# Altium footprint library 全库.PcbLib: 967 footprints (part 33 of 61)
Each footprint in its own frame and in the unit in brackets; x right, y up, seen from the top. Pads: shape width x height; smd on the part's side, far side on the other; paste and mask are expansions set on the pad; w line width, h text height; cw(c..) or ccw(c..) is an arc to the next point about the centre after c.
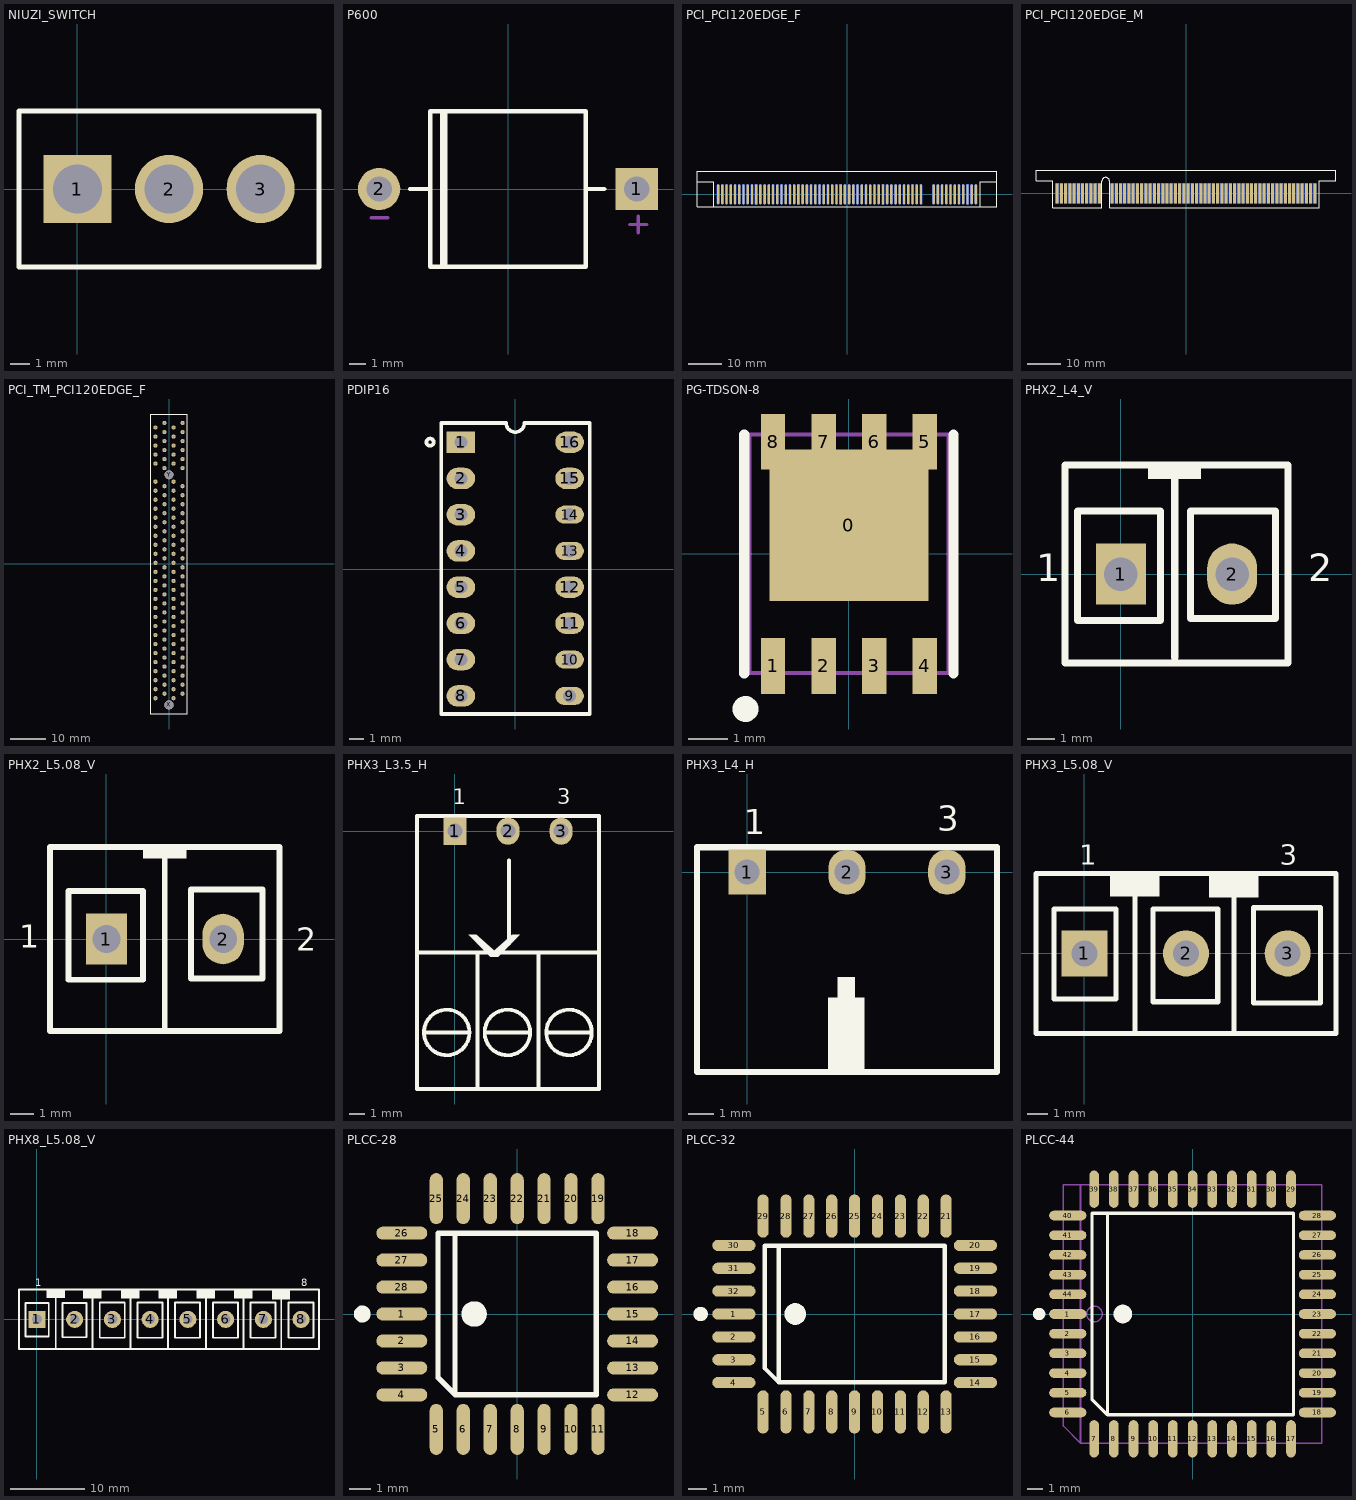
[diagram p32: the footprints below, top view; thin cyan lines are the x and y axes]

## NIUZI_SWITCH [mm] "3.81mm(150mil)焊线"
pads (3):
  rect 3.5x3.5 hole 2.5: 1(0,0)
  round 3.5 hole 2.5: 2(4.7,0) 3(9.4,0)
Top Overlay:
  lines w0.254: -3,-4 -3,4 12.4,4 12.4,-4 -3,-4

## P600 [mm]
pads (2):
  rect 2.5x2.5 hole 1.5: 1(7.62,0)
  round 2.5 hole 1.5: 2(-7.62,0)
Top Overlay:
  lines w0.254: -5.8,0 -4.6,0 ; -3.9,-4.6 -3.9,4.6 ; -3.7,-4.6 -3.7,4.6 ; 4.6,0 5.7,0 ; -4.6,-4.6 4.6,-4.6 4.6,4.6 -4.6,4.6 -4.6,-4.6
Mechanical 15:
  lines w0.203: -8.1,-1.7 -7.1,-1.7 ; 7.2,-2.1 8.2,-2.1 ; 7.7,-2.6 7.7,-1.6

## PCI_PCI120EDGE_F [mm]
pads (120):
  oval 0.7x6 smd: A1(-38.735,0) A2(-37.465,0) A3(-36.195,0) A4(-34.925,0) A5(-33.655,0) A6(-32.385,0) A7(-31.115,0) A8(-29.845,0) A9(-28.575,0) A11(-26.035,0) A12(-24.765,0) A13(-23.495,0) A14(-22.225,0) A15(-20.955,0) A16(-19.685,0) A17(-18.415,0) A18(-17.145,0) A19(-15.875,0) A21(-13.335,0) A22(-12.065,0) A23(-10.795,0) A24(-9.525,0) A25(-8.255,0) A26(-6.985,0) A27(-5.715,0) A28(-4.445,0) A29(-3.175,0) A31(-0.635,0) A32(0.635,0) A33(1.905,0) A34(3.175,0) A35(4.445,0) A36(5.715,0) A37(6.985,0) A38(8.255,0) A39(9.525,0) A41(12.065,0) A42(13.335,0) A43(14.605,0) A44(15.875,0) A45(17.145,0) A46(18.415,0) A47(19.685,0) A48(20.955,0) A49(22.225,0) A52(26.035,0) A53(27.305,0) A54(28.575,0) A55(29.845,0) A56(31.115,0) A57(32.385,0) A58(33.655,0) A59(34.925,0) A61(37.465,0) A62(38.735,0)
  rect 0.7x6 smd: A10(-27.305,0) A20(-14.605,0) A30(-1.905,0) A40(10.795,0) A60(36.195,0)
  oval 0.7x6 smd far side: B1(-38.735,0) B2(-37.465,0) B3(-36.195,0) B4(-34.925,0) B5(-33.655,0) B6(-32.385,0) B7(-31.115,0) B8(-29.845,0) B9(-28.575,0) B11(-26.035,0) B12(-24.765,0) B13(-23.495,0) B14(-22.225,0) B15(-20.955,0) B16(-19.685,0) B17(-18.415,0) B18(-17.145,0) B19(-15.875,0) B21(-13.335,0) B22(-12.065,0) B23(-10.795,0) B24(-9.525,0) B25(-8.255,0) B26(-6.985,0) B27(-5.715,0) B28(-4.445,0) B29(-3.175,0) B31(-0.635,0) B32(0.635,0) B33(1.905,0) B34(3.175,0) B35(4.445,0) B36(5.715,0) B37(6.985,0) B38(8.255,0) B39(9.525,0) B41(12.065,0) B42(13.335,0) B43(14.605,0) B44(15.875,0) B45(17.145,0) B46(18.415,0) B47(19.685,0) B48(20.955,0) B49(22.225,0) B52(26.035,0) B53(27.305,0) B54(28.575,0) B55(29.845,0) B56(31.115,0) B57(32.385,0) B58(33.655,0) B59(34.925,0) B61(37.465,0) B62(38.735,0)
  rect 0.7x6 smd far side: B10(-27.305,0) B20(-14.605,0) B30(-1.905,0) B40(10.795,0) B60(36.195,0)
Top Overlay:
  lines w0.2: -45.085,3.81 -45.085,-3.81 -40.005,-3.81 ; -45.085,3.81 -45.085,6.985 45.085,6.985 45.085,3.81 ; -45.085,3.81 -40.005,3.81 -40.005,-3.81 ; -40.005,-3.81 25.273,-3.81 40.005,-3.81 ; 40.005,-3.81 45.085,-3.81 45.085,3.81 ; 40.005,-3.81 40.005,3.81 45.085,3.81
Bottom Overlay:
  lines w0.2: -45.085,3.81 -45.085,-3.81 -40.005,-3.81 ; -45.085,3.81 -45.085,6.985 45.085,6.985 45.085,3.81 ; -45.085,3.81 -40.005,3.81 -40.005,-3.81 ; -40.005,-3.81 25.273,-3.81 40.005,-3.81 ; 40.005,-3.81 45.085,-3.81 45.085,3.81 ; 40.005,-3.81 40.005,3.81 45.085,3.81

## PCI_PCI120EDGE_M [mm]
pads (120):
  rect 0.9x6 smd: A1(38.735,0) A2(37.465,0) A3(36.195,0) A4(34.925,0) A5(33.655,0) A6(32.385,0) A7(31.115,0) A8(29.845,0) A9(28.575,0) A10(27.305,0) A11(26.035,0) A12(24.765,0) A13(23.495,0) A14(22.225,0) A15(20.955,0) A16(19.685,0) A17(18.415,0) A18(17.145,0) A19(15.875,0) A20(14.605,0) A21(13.335,0) A22(12.065,0) A23(10.795,0) A24(9.525,0) A25(8.255,0) A26(6.985,0) A27(5.715,0) A28(4.445,0) A29(3.175,0) A30(1.905,0) A31(0.635,0) A32(-0.635,0) A33(-1.905,0) A34(-3.175,0) A35(-4.445,0) A36(-5.715,0) A37(-6.985,0) A38(-8.255,0) A39(-9.525,0) A40(-10.795,0) A41(-12.065,0) A42(-13.335,0) A43(-14.605,0) A44(-15.875,0) A45(-17.145,0) A46(-18.415,0) A47(-19.685,0) A48(-20.955,0) A49(-22.225,0) A52(-26.035,0) A53(-27.305,0) A54(-28.575,0) A55(-29.845,0) A56(-31.115,0) A57(-32.385,0) A58(-33.655,0) A59(-34.925,0) A60(-36.195,0) A61(-37.465,0) A62(-38.735,0)
  rect 0.9x6 smd far side: B1(38.735,0) B2(37.465,0) B3(36.195,0) B4(34.925,0) B5(33.655,0) B6(32.385,0) B7(31.115,0) B8(29.845,0) B9(28.575,0) B10(27.305,0) B11(26.035,0) B12(24.765,0) B13(23.495,0) B14(22.225,0) B15(20.955,0) B16(19.685,0) B17(18.415,0) B18(17.145,0) B19(15.875,0) B20(14.605,0) B21(13.335,0) B22(12.065,0) B23(10.795,0) B24(9.525,0) B25(8.255,0) B26(6.985,0) B27(5.715,0) B28(4.445,0) B29(3.175,0) B30(1.905,0) B31(0.635,0) B32(-0.635,0) B33(-1.905,0) B34(-3.175,0) B35(-4.445,0) B36(-5.715,0) B37(-6.985,0) B38(-8.255,0) B39(-9.525,0) B40(-10.795,0) B41(-12.065,0) B42(-13.335,0) B43(-14.605,0) B44(-15.875,0) B45(-17.145,0) B46(-18.415,0) B47(-19.685,0) B48(-20.955,0) B49(-22.225,0) B52(-26.035,0) B53(-27.305,0) B54(-28.575,0) B55(-29.845,0) B56(-31.115,0) B57(-32.385,0) B58(-33.655,0) B59(-34.925,0) B60(-36.195,0) B61(-37.465,0) B62(-38.735,0)
Top Overlay:
  lines w0.2: -45.085,3.81 -40.005,3.81 -40.005,-4.31 -25.273,-4.31 -25.273,3.683 cw(c-24.13,3.683) -22.987,3.683 -22.987,-4.31 40.005,-4.31 40.005,3.81 45.085,3.81 45.085,6.985 -45.085,6.985 -45.085,3.81
Bottom Overlay:
  lines w0.2: -45.085,3.81 -40.005,3.81 -40.005,-4.31 -25.273,-4.31 -25.273,3.683 cw(c-24.13,3.683) -22.987,3.683 -22.987,-4.31 40.005,-4.31 40.005,3.81 45.085,3.81 45.085,6.985 -45.085,6.985 -45.085,3.81

## PCI_TM_PCI120EDGE_F [mm]
pads (122):
  round 1.2 hole 0.6: A1(-3.81,-37.779) A2(-1.27,-36.509) A3(-3.81,-35.239) A4(-1.27,-33.969) A5(-3.81,-32.699) A6(-1.27,-31.429) A7(-3.81,-30.159) A8(-1.27,-28.889) A9(-3.81,-27.619) A10(-1.27,-26.349) A11(-3.81,-25.079) A12(-1.27,-23.809) A13(-3.81,-22.539) A14(-1.27,-21.269) A15(-3.81,-19.999) A16(-1.27,-18.729) A17(-3.81,-17.459) A18(-1.27,-16.189) A19(-3.81,-14.919) A20(-1.27,-13.649) A21(-3.81,-12.379) A22(-1.27,-11.109) A23(-3.81,-9.839) A24(-1.27,-8.569) A25(-3.81,-7.299) A26(-1.27,-6.029) A27(-3.81,-4.759) A28(-1.27,-3.489) A29(-3.81,-2.219) A30(-1.27,-0.949) A31(-3.81,0.321) A32(-1.27,1.591) A33(-3.81,2.861) A34(-1.27,4.131) A35(-3.81,5.401) A36(-1.27,6.671) A37(-3.81,7.941) A38(-1.27,9.211) A39(-3.81,10.481) A40(-1.27,11.751) A41(-3.81,13.021) A42(-1.27,14.291) A43(-3.81,15.561) A44(-1.27,16.831) A45(-3.81,18.101) A46(-1.27,19.371) A47(-3.81,20.641) A48(-1.27,21.911) A49(-3.81,23.181) A52(-1.27,26.991) A53(-3.81,28.261) A54(-1.27,29.531) A55(-3.81,30.801) A56(-1.27,32.071) A57(-3.81,33.341) A58(-1.27,34.611) A59(-3.81,35.881) A60(-1.27,37.151) A61(-3.81,38.421) A62(-1.27,39.691) B1(1.27,-37.779) B2(3.81,-36.509) B3(1.27,-35.239) B4(3.81,-33.969) B5(1.27,-32.699) B6(3.81,-31.429) B7(1.27,-30.159) B8(3.81,-28.889) B9(1.27,-27.619) B10(3.81,-26.349) B11(1.27,-25.079) B12(3.81,-23.809) B13(1.27,-22.539) B14(3.81,-21.269) B15(1.27,-19.999) B16(3.81,-18.729) B17(1.27,-17.459) B18(3.81,-16.189) B19(1.27,-14.919) B20(3.81,-13.649) B21(1.27,-12.379) B22(3.81,-11.109) B23(1.27,-9.839) B24(3.81,-8.569) B25(1.27,-7.299) B26(3.81,-6.029) B27(1.27,-4.759) B28(3.81,-3.489) B29(1.27,-2.219) B30(3.81,-0.949) B31(1.27,0.321) B32(3.81,1.591) B33(1.27,2.861) B34(3.81,4.131) B35(1.27,5.401) B36(3.81,6.671) B37(1.27,7.941) B38(3.81,9.211) B39(1.27,10.481) B40(3.81,11.751) B41(1.27,13.021) B42(3.81,14.291) B43(1.27,15.561) B44(3.81,16.831) B45(1.27,18.101) B46(3.81,19.371) B47(1.27,20.641) B48(3.81,21.911) B49(1.27,23.181) B52(3.81,26.991) B53(1.27,28.261) B54(3.81,29.531) B55(1.27,30.801) B56(3.81,32.071) B57(1.27,33.341) B58(3.81,34.611) B59(1.27,35.881) B60(3.81,37.151) B61(1.27,38.421) B62(3.81,39.691)
  round 2.5 hole 2.44: X(0,-39.679) Y(0,25.091)
Top Overlay:
  lines w0.254: -5.08,-42.229 -5.08,42.221 5.08,42.221 5.08,-42.221 -5.08,-42.221

## PDIP16 [mm]
pads (16):
  rect 2x1.5 hole 0.9: 1(-3.81,8.89)
  oval 2x1.5 hole 0.9: 2(-3.81,6.35) 3(-3.81,3.81) 4(-3.81,1.27) 5(-3.81,-1.27) 6(-3.81,-3.81) 7(-3.81,-6.35) 8(-3.81,-8.89) 11(3.81,-3.81) 12(3.81,-1.27) 15(3.81,6.35) 16(3.81,8.89)
  oval 2x1.27 hole 0.9: 9(3.81,-8.89) 10(3.81,-6.35) 13(3.81,1.27) 14(3.81,3.81)
Top Overlay:
  circle w0.254: c-5.969,8.89 r0.254
  lines w0.254: -5.19,-10.16 -5.19,10.23 -0.635,10.23 ccw(c0,10.23) 0.635,10.23 5.21,10.23 5.21,-10.16 -5.19,-10.16

## PG-TDSON-8 [mm]
pads (9):
  rect 4x3.81 smd: 0(0,0.716)
  rect 0.61x1.4 smd: 1(-1.905,-2.816) 2(-0.635,-2.816) 3(0.635,-2.816) 4(1.905,-2.816) 5(1.905,2.816) 6(0.635,2.816) 7(-0.635,2.816) 8(-1.905,2.816)
Top Overlay:
  circle w0.4: c-2.6,-3.9 r0.125
  lines w0.254: -2.63,-3 -2.63,3 ; 2.63,-3 2.63,3
Mechanical 13:
  lines w0.1: -2.5,-3 2.5,-3 2.5,3 -2.5,3 -2.5,-3

## PHX2_L4_V [mm]
pads (2):
  rect 1.8x2.2 hole 1.2: 1(0,0)
  oval 1.8x2.2 hole 1.2: 2(4,0)
Top Overlay:
  rectangle: 0.984,3.413 2.889,3.913
  lines w0.254: 1.937,-3 1.937,3.596 ; -2,-3.191 6,-3.191 6,3.913 -2,3.913 -2,-3.191 ; -1.556,-1.667 1.429,-1.667 1.429,2.27 -1.556,2.27 -1.556,-1.667 ; 2.508,-1.603 2.508,2.27 5.556,2.27 5.556,-1.603 2.508,-1.603
  text "2" at 6.731,-0.254 h1
  text "1" at -3.048,-0.254 h1

## PHX2_L5.08_V [mm]
pads (2):
  rect 1.8x2.2 hole 1.2: 1(0,0)
  oval 1.8x2.2 hole 1.2: 2(5.08,0)
Top Overlay:
  rectangle: 1.587,3.5 3.492,4
  lines w0.254: 2.54,-4 2.54,4 ; -2.46,-4 -2.46,4 7.54,4 7.54,-4 -2.46,-4 ; -1.651,-1.778 -1.651,2.095 1.587,2.095 1.587,-1.778 -1.651,-1.778 ; 3.683,-1.714 6.794,-1.714 6.794,2.159 3.683,2.159 3.683,-1.714
  text "1" at -3.81,-0.381 h1
  text "2" at 8.255,-0.508 h1

## PHX3_L3.5_H [mm]
pads (3):
  rect 1.5x1.8 hole 1: 1(0,0)
  oval 1.5x1.8 hole 1: 2(3.5,0) 3(7,0)
Top Overlay:
  circle w0.254: c7.525,-13.271 r1.5
  circle w0.254: c3.461,-13.271 r1.5
  circle w0.254: c-0.54,-13.271 r1.5
  lines w0.254: -2.5,-8 9.5,-8 ; -1.865,-13.271 0.802,-13.271 ; 1.5,-17 1.5,-8 ; 2.135,-13.271 4.802,-13.271 ; 3.564,-7.422 3.564,-1.922 ; 5.5,-17 5.5,-8 ; 6.199,-13.271 8.866,-13.271 ; -2.5,-17 -2.5,1 9.5,1 9.5,-17 -2.5,-17
  text "3" at 6.731,1.778 h1
  text "1" at -0.127,1.778 h1
  text "^" at 4.897,-4.318 h4

## PHX3_L4_H [mm]
pads (3):
  rect 1.5x1.8 hole 1: 1(0,0)
  oval 1.5x1.8 hole 1: 2(4,0) 3(8,0)
Top Overlay:
  rectangle: 3.619,-7.993 4.317,-4.183
  rectangle: 3.238,-7.993 4.698,-5.009
  lines w0.254: -2,-7.993 10,-7.993 10,1 -2,1 -2,-7.993
  text "1" at -0.127,1.524 h1
  text "3" at 7.62,1.651 h1

## PHX3_L5.08_V [mm]
pads (3):
  rect 2.3x2.3 hole 1.3: 1(0,0)
  round 2.3 hole 1.3: 2(5.08,0) 3(10.16,0)
Top Overlay:
  rectangle: 1.27,2.857 3.746,4
  rectangle: 6.223,2.794 8.7,4
  lines w0.254: 2.533,-4 2.533,4 ; 7.486,-4 7.486,4 ; -2.42,-4 12.58,-4 12.58,4 -2.42,4 -2.42,-4 ; -1.524,-2.286 -1.524,2.222 1.587,2.222 1.587,-2.286 -1.524,-2.286 ; 3.429,-2.413 3.429,2.222 6.667,2.222 6.667,-2.413 3.429,-2.413 ; 8.445,-2.476 8.445,2.286 11.811,2.286 11.811,-2.476 8.445,-2.476
  text "1" at -0.254,4.445 h1
  text "3" at 9.779,4.445 h1

## PHX8_L5.08_V [mm]
pads (8):
  rect 2.3x2.3 hole 1.3: 1(0,0)
  round 2.3 hole 1.3: 2(5.08,0) 3(10.16,0) 4(15.24,0) 5(20.32,0) 6(25.4,0) 7(30.48,0) 8(35.56,0)
Top Overlay:
  rectangle: 31.623,2.667 34.099,3.873
  rectangle: 26.543,2.794 29.019,4
  rectangle: 21.463,2.794 23.939,4
  rectangle: 16.383,2.794 18.86,4
  rectangle: 11.303,2.794 13.779,4
  rectangle: 1.27,2.857 3.746,4
  rectangle: 6.223,2.794 8.7,4
  lines w0.254: 2.533,-4 2.533,4 ; 7.486,-4 7.486,4 ; 12.573,-4 12.573,4 ; 17.653,-4 17.653,4 ; 22.733,-4 22.733,4 ; 27.813,-4 27.813,4 ; 32.893,-4 32.893,4 ; -2.42,-4 37.973,-4 37.973,4 -2.42,4 -2.42,-4 ; -1.524,-2.286 -1.524,2.222 1.587,2.222 1.587,-2.286 -1.524,-2.286 ; 3.429,-2.413 3.429,2.222 6.667,2.222 6.667,-2.413 3.429,-2.413 ; 8.445,-2.476 8.445,2.286 11.811,2.286 11.811,-2.476 8.445,-2.476 ; 13.525,-2.476 16.891,-2.476 16.891,2.286 13.525,2.286 13.525,-2.476 ; 18.605,-2.476 21.971,-2.476 21.971,2.286 18.605,2.286 18.605,-2.476 ; 23.685,-2.476 27.051,-2.476 27.051,2.286 23.685,2.286 23.685,-2.476 ; 28.765,-2.476 32.131,-2.476 32.131,2.286 28.765,2.286 28.765,-2.476 ; 33.846,-2.476 37.211,-2.476 37.211,2.286 33.846,2.286 33.846,-2.476
  text "1" at -0.254,4.445 h1
  text "8" at 35.56,4.445 h1

## PLCC-28 [mm]
pads (28):
  oval 2.4x0.62 smd: 1(-5.435,0) 2(-5.435,-1.27) 3(-5.435,-2.54) 4(-5.435,-3.81) 12(5.435,-3.81) 13(5.435,-2.54) 14(5.435,-1.27) 15(5.435,0) 16(5.435,1.27) 17(5.435,2.54) 18(5.435,3.81) 26(-5.435,3.81) 27(-5.435,2.54) 28(-5.435,1.27)
  oval 0.62x2.4 smd: 5(-3.81,-5.435) 6(-2.54,-5.435) 7(-1.27,-5.435) 8(0,-5.435) 9(1.27,-5.435) 10(2.54,-5.435) 11(3.81,-5.435) 19(3.81,5.435) 20(2.54,5.435) 21(1.27,5.435) 22(0,5.435) 23(-1.27,5.435) 24(-2.54,5.435) 25(-3.81,5.435)
Top Overlay:
  circle w0.4: c-7.3,0 r0.2
  circle w0.6: c-2.03,0 r0.3
  lines w0.254: -2.93,3.8 -2.93,-3.8 ; -2.93,-3.8 -3.73,-3 -3.73,3.8 3.73,3.8 3.73,-3.8 -2.93,-3.8

## PLCC-32 [mm]
pads (32):
  oval 2.4x0.62 smd: 1(-6.705,0) 2(-6.705,-1.27) 3(-6.705,-2.54) 4(-6.705,-3.81) 14(6.705,-3.81) 15(6.705,-2.54) 16(6.705,-1.27) 17(6.705,0) 18(6.705,1.27) 19(6.705,2.54) 20(6.705,3.81) 30(-6.705,3.81) 31(-6.705,2.54) 32(-6.705,1.27)
  oval 0.62x2.4 smd: 5(-5.08,-5.435) 6(-3.81,-5.435) 7(-2.54,-5.435) 8(-1.27,-5.435) 9(0,-5.435) 10(1.27,-5.435) 11(2.54,-5.435) 12(3.81,-5.435) 13(5.08,-5.435) 21(5.08,5.435) 22(3.81,5.435) 23(2.54,5.435) 24(1.27,5.435) 25(0,5.435) 26(-1.27,5.435) 27(-2.54,5.435) 28(-3.81,5.435) 29(-5.08,5.435)
Top Overlay:
  circle w0.4: c-8.55,0 r0.2
  circle w0.6: c-3.3,0 r0.3
  lines w0.254: -4.2,3.8 -4.2,-3.8 ; -4.2,-3.8 5,-3.8 5,3.8 -5,3.8 -5,-3 -4.2,-3.8

## PLCC-44 [mm]
pads (44):
  oval 2.4x0.62 smd: 1(-8.05,0) 2(-8.05,-1.27) 3(-8.05,-2.54) 4(-8.05,-3.81) 5(-8.05,-5.08) 6(-8.05,-6.35) 18(8.05,-6.35) 19(8.05,-5.08) 20(8.05,-3.81) 21(8.05,-2.54) 22(8.05,-1.27) 23(8.05,0) 24(8.05,1.27) 25(8.05,2.54) 26(8.05,3.81) 27(8.05,5.08) 28(8.05,6.35) 40(-8.05,6.35) 41(-8.05,5.08) 42(-8.05,3.81) 43(-8.05,2.54) 44(-8.05,1.27)
  oval 0.62x2.4 smd: 7(-6.35,-8.05) 8(-5.08,-8.05) 9(-3.81,-8.05) 10(-2.54,-8.05) 11(-1.27,-8.05) 12(0,-8.05) 13(1.27,-8.05) 14(2.54,-8.05) 15(3.81,-8.05) 16(5.08,-8.05) 17(6.35,-8.05) 29(6.35,8.05) 30(5.08,8.05) 31(3.81,8.05) 32(2.54,8.05) 33(1.27,8.05) 34(0,8.05) 35(-1.27,8.05) 36(-2.54,8.05) 37(-3.81,8.05) 38(-5.08,8.05) 39(-6.35,8.05)
Top Overlay:
  circle w0.4: c-9.9,0 r0.2
  circle w0.6: c-4.5,0 r0.3
  lines w0.2: -5.5,6.5 -5.5,-6.5 ; -5.5,-6.5 -6.5,-5.5 -6.5,6.5 6.5,6.5 6.5,-6.5 -5.5,-6.5
Mechanical 13:
  circle w0.1: c-6.33,0 r0.5
  lines w0.1: -7.23,8.33 -7.23,-8.33 ; -7.23,-8.33 8.33,-8.33 8.33,8.33 -8.33,8.33 -8.33,-7.23 -7.23,-8.33